# Altium schematic symbol library Capacitor - Aluminium TH.SchLib: 4591 symbols (part 21 of 27) (continued)
## UPS0J103MHD (continued)
CAP ALUM 10000UF 20% 6.3V RADIAL; Part Number: UPS0J103MHD; Manufacturer: Nichicon; TemperatureRange: -55C ~ 105C; Type: Polar; Ripple Current: 2.045A @ 120Hz; Impedance: 33 mOhm; Value: 10000uF; PartId: 27151; Supplier 1: Digi-Key; Supplier Part Number 1: 493-5648-ND; ComponentLink1Description: Datasheet; ComponentLink1URL: http://nichicon-us.com/english/products/pdfs/e-ups.pdf; ComponentLink2Description: Digi-Key Listing; ComponentLink2URL: https://www.digikey.com/product-detail/en/nichicon/UPS0J103MHD/493-5648-ND/2599886; Tolerance: 20%; Voltage: 6.3V; Price: 1.85; Device Package: Radial, Can, 16mm
footprint CAP AL TH D16 L7.5 H33.5
pins: 1, 2

## UPS0J222MHD1TO
designator C?, comment 2200uF  (value not drawn)
CAP ALUM 2200UF 20% 6.3V RADIAL; Part Number: UPS0J222MHD1TO; Manufacturer: Nichicon; TemperatureRange: -55C ~ 105C; Type: Polar; Ripple Current: 1.088A @ 120Hz; Impedance: 75 mOhm; Value: 2200uF; PartId: 23131; Supplier 1: Digi-Key; Supplier Part Number 1: 493-5345-3-ND; ComponentLink1Description: Datasheet; ComponentLink1URL: http://nichicon-us.com/english/products/pdfs/e-ups.pdf; ComponentLink2Description: Digi-Key Listing; ComponentLink2URL: https://www.digikey.com/product-detail/en/nichicon/UPS0J222MHD1TO/493-5345-3-ND/3130350; Tolerance: 20%; Voltage: 6.3V; Price: 0.242; Device Package: Radial, Can, 12.5mm
footprint CAP AL TH D12.5 L5 H22
pins: 1, 2

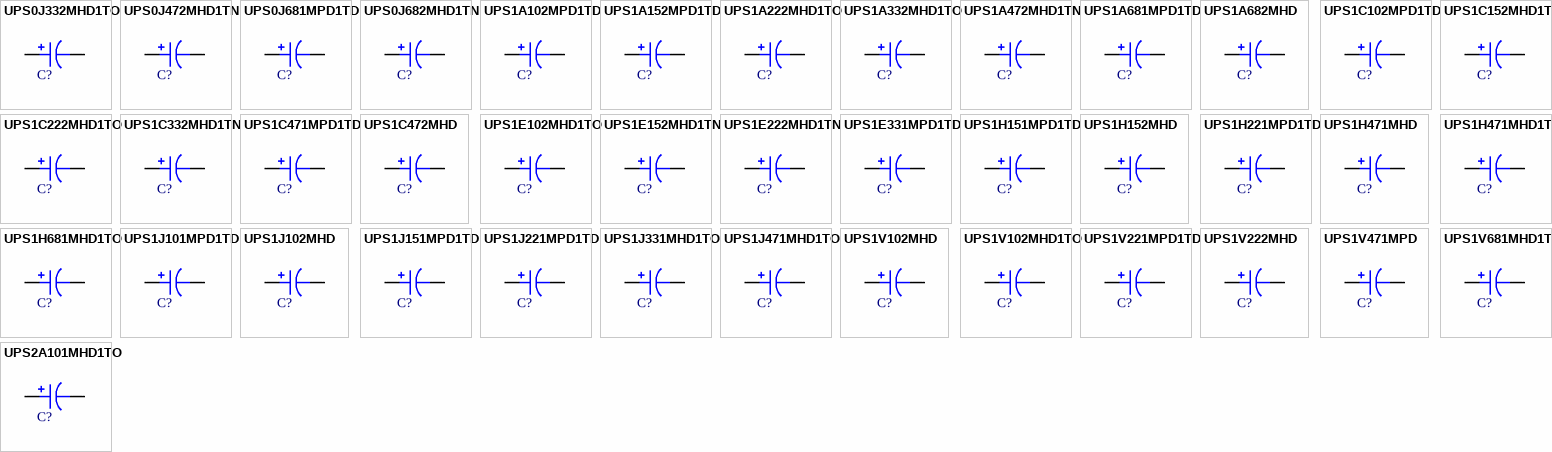
[diagram p90: symbols UPS0J332MHD1TO to UPS2A101MHD1TO]

## UPS0J332MHD1TO
designator C?, comment 3300uF  (value not drawn)
CAP ALUM 3300UF 20% 6.3V RADIAL; Part Number: UPS0J332MHD1TO; Manufacturer: Nichicon; TemperatureRange: -55C ~ 105C; Type: Polar; Ripple Current: 1.088A @ 120Hz; Impedance: 75 mOhm; Value: 3300uF; PartId: 23130; Supplier 1: Digi-Key; Supplier Part Number 1: 493-5348-3-ND; ComponentLink1Description: Datasheet; ComponentLink1URL: http://nichicon-us.com/english/products/pdfs/e-ups.pdf; ComponentLink2Description: Digi-Key Listing; ComponentLink2URL: https://www.digikey.com/product-detail/en/nichicon/UPS0J332MHD1TO/493-5348-3-ND/3130353; Tolerance: 20%; Voltage: 6.3V; Price: 0.2408; Device Package: Radial, Can, 12.5mm
footprint CAP AL TH D12.5 L5 H22
pins: 1, 2

## UPS0J472MHD1TN
designator C?, comment 4700uF  (value not drawn)
CAP ALUM 4700UF 20% 6.3V RADIAL; Part Number: UPS0J472MHD1TN; Manufacturer: Nichicon; TemperatureRange: -55C ~ 105C; Type: Polar; Ripple Current: 1.653A @ 120Hz; Impedance: 38 mOhm; Value: 4700uF; PartId: 26734; Supplier 1: Digi-Key; Supplier Part Number 1: 493-5349-3-ND; ComponentLink1Description: Datasheet; ComponentLink1URL: http://nichicon-us.com/english/products/pdfs/e-ups.pdf; ComponentLink2Description: Digi-Key Listing; ComponentLink2URL: https://www.digikey.com/product-detail/en/nichicon/UPS0J472MHD1TN/493-5349-3-ND/3130354; Tolerance: 20%; Voltage: 6.3V; Price: 0.4559; Device Package: Radial, Can, 16mm
footprint CAP AL TH D16 L7.5 H27
pins: 1, 2

## UPS0J681MPD1TD
designator C?, comment 680uF  (value not drawn)
CAP ALUM 680UF 20% 6.3V RADIAL; Part Number: UPS0J681MPD1TD; Manufacturer: Nichicon; TemperatureRange: -55C ~ 105C; Type: Polar; Ripple Current: 426mA @ 120Hz; Impedance: 190 mOhm; Value: 680uF; PartId: 24516; Supplier 1: Digi-Key; Supplier Part Number 1: 493-5350-3-ND; ComponentLink1Description: Datasheet; ComponentLink1URL: http://nichicon-us.com/english/products/pdfs/e-ups.pdf; ComponentLink2Description: Digi-Key Listing; ComponentLink2URL: https://www.digikey.com/product-detail/en/nichicon/UPS0J681MPD1TD/493-5350-3-ND/3130355; Tolerance: 20%; Voltage: 6.3V; Price: 0.1325; Device Package: Radial, Can, 10mm
footprint CAP AL TH D10 L5 H14.5
pins: 1, 2

## UPS0J682MHD1TN
designator C?, comment 6800uF  (value not drawn)
CAP ALUM 6800UF 20% 6.3V RADIAL; Part Number: UPS0J682MHD1TN; Manufacturer: Nichicon; TemperatureRange: -55C ~ 105C; Type: Polar; Ripple Current: 1.653A @ 120Hz; Impedance: 38 mOhm; Value: 6800uF; PartId: 26744; Supplier 1: Digi-Key; Supplier Part Number 1: 493-5351-3-ND; ComponentLink1Description: Datasheet; ComponentLink1URL: http://nichicon-us.com/english/products/pdfs/e-ups.pdf; ComponentLink2Description: Digi-Key Listing; ComponentLink2URL: https://www.digikey.com/product-detail/en/nichicon/UPS0J682MHD1TN/493-5351-3-ND/3130356; Tolerance: 20%; Voltage: 6.3V; Price: 0.5072; Device Package: Radial, Can, 16mm
footprint CAP AL TH D16 L7.5 H27
pins: 1, 2

## UPS1A102MPD1TD
designator C?, comment 1000uF  (value not drawn)
CAP ALUM 1000UF 20% 10V RADIAL; Part Number: UPS1A102MPD1TD; Manufacturer: Nichicon; TemperatureRange: -55C ~ 105C; Type: Polar; Ripple Current: 696mA @ 120Hz; Impedance: 140 mOhm; Value: 1000uF; PartId: 25020; Supplier 1: Digi-Key; Supplier Part Number 1: 493-11831-3-ND; ComponentLink1Description: Datasheet; ComponentLink1URL: http://nichicon-us.com/english/products/pdfs/e-ups.pdf; ComponentLink2Description: Digi-Key Listing; ComponentLink2URL: https://www.digikey.com/product-detail/en/nichicon/UPS1A102MPD1TD/493-11831-3-ND/4320974; Tolerance: 20%; Voltage: 10V; Price: 0.1626; Device Package: Radial, Can, 10mm
footprint CAP AL TH D10 L5 H17.5
pins: 1, 2

## UPS1A152MPD1TD
designator C?, comment 1500uF  (value not drawn)
CAP ALUM 1500UF 20% 10V RADIAL; Part Number: UPS1A152MPD1TD; Manufacturer: Nichicon; TemperatureRange: -55C ~ 105C; Type: Polar; Ripple Current: 870mA @ 120Hz; Impedance: 110 mOhm; Value: 1500uF; PartId: 25756; Supplier 1: Digi-Key; Supplier Part Number 1: 493-11921-3-ND; ComponentLink1Description: Datasheet; ComponentLink1URL: http://nichicon-us.com/english/products/pdfs/e-ups.pdf; ComponentLink2Description: Digi-Key Listing; ComponentLink2URL: https://www.digikey.com/product-detail/en/nichicon/UPS1A152MPD1TD/493-11921-3-ND/4321064; Tolerance: 20%; Voltage: 10V; Price: 0.2038; Device Package: Radial, Can, 10mm
footprint CAP AL TH D10 L5 H22
pins: 1, 2

## UPS1A222MHD1TO
designator C?, comment 2200uF  (value not drawn)
CAP ALUM 2200UF 20% 10V RADIAL; Part Number: UPS1A222MHD1TO; Manufacturer: Nichicon; TemperatureRange: -55C ~ 105C; Type: Polar; Ripple Current: 1.088A @ 120Hz; Impedance: 75 mOhm; Value: 2200uF; PartId: 23250; Supplier 1: Digi-Key; Supplier Part Number 1: 493-11982-1-ND; ComponentLink1Description: Datasheet; ComponentLink1URL: http://nichicon-us.com/english/products/pdfs/e-ups.pdf; ComponentLink2Description: Digi-Key Listing; ComponentLink2URL: https://www.digikey.com/product-detail/en/nichicon/UPS1A222MHD1TO/493-11982-1-ND/4319709; Tolerance: 20%; Voltage: 10V; Price: 0.7; Device Package: Radial, Can, 12.5mm
footprint CAP AL TH D12.5 L5 H22
pins: 1, 2

## UPS1A332MHD1TO
designator C?, comment 3300uF  (value not drawn)
CAP ALUM 3300UF 20% 10V RADIAL; Part Number: UPS1A332MHD1TO; Manufacturer: Nichicon; TemperatureRange: -55C ~ 105C; Type: Polar; Ripple Current: 1.349A @ 120Hz; Impedance: 57 mOhm; Value: 3300uF; PartId: 23998; Supplier 1: Digi-Key; Supplier Part Number 1: 493-12174-1-ND; ComponentLink1Description: Datasheet; ComponentLink1URL: http://nichicon-us.com/english/products/pdfs/e-ups.pdf; ComponentLink2Description: Digi-Key Listing; ComponentLink2URL: https://www.digikey.com/product-detail/en/nichicon/UPS1A332MHD1TO/493-12174-1-ND/4319711; Tolerance: 20%; Voltage: 10V; Price: 1.04; Device Package: Radial, Can, 12.5mm
footprint CAP AL TH D12.5 L5 H27
pins: 1, 2

## UPS1A472MHD1TN
designator C?, comment 4700uF  (value not drawn)
CAP ALUM 4700UF 20% 10V RADIAL; Part Number: UPS1A472MHD1TN; Manufacturer: Nichicon; TemperatureRange: -55C ~ 105C; Type: Polar; Ripple Current: 1.653A @ 120Hz; Impedance: 38 mOhm; Value: 4700uF; PartId: 26742; Supplier 1: Digi-Key; Supplier Part Number 1: 493-12166-3-ND; ComponentLink1Description: Datasheet; ComponentLink1URL: http://nichicon-us.com/english/products/pdfs/e-ups.pdf; ComponentLink2Description: Digi-Key Listing; ComponentLink2URL: https://www.digikey.com/product-detail/en/nichicon/UPS1A472MHD1TN/493-12166-3-ND/4321309; Tolerance: 20%; Voltage: 10V; Price: 0.5054; Device Package: Radial, Can, 16mm
footprint CAP AL TH D16 L7.5 H27
pins: 1, 2

## UPS1A681MPD1TD
designator C?, comment 680uF  (value not drawn)
CAP ALUM 680UF 20% 10V RADIAL; Part Number: UPS1A681MPD1TD; Manufacturer: Nichicon; TemperatureRange: -55C ~ 105C; Type: Polar; Ripple Current: 426mA @ 120Hz; Impedance: 190 mOhm; Value: 680uF; PartId: 24538; Supplier 1: Digi-Key; Supplier Part Number 1: 493-5355-3-ND; ComponentLink1Description: Datasheet; ComponentLink1URL: http://nichicon-us.com/english/products/pdfs/e-ups.pdf; ComponentLink2Description: Digi-Key Listing; ComponentLink2URL: https://www.digikey.com/product-detail/en/nichicon/UPS1A681MPD1TD/493-5355-3-ND/3130360; Tolerance: 20%; Voltage: 10V; Price: 0.1464; Device Package: Radial, Can, 10mm
footprint CAP AL TH D10 L5 H14.5
pins: 1, 2

## UPS1A682MHD
designator C?, comment 6800uF  (value not drawn)
CAP ALUM 6800UF 20% 10V RADIAL; Part Number: UPS1A682MHD; Manufacturer: Nichicon; TemperatureRange: -55C ~ 105C; Type: Polar; Ripple Current: 2.045A @ 120Hz; Impedance: 33 mOhm; Value: 6800uF; PartId: 27155; Supplier 1: Digi-Key; Supplier Part Number 1: 493-5651-ND; ComponentLink1Description: Datasheet; ComponentLink1URL: http://nichicon-us.com/english/products/pdfs/e-ups.pdf; ComponentLink2Description: Digi-Key Listing; ComponentLink2URL: https://www.digikey.com/product-detail/en/nichicon/UPS1A682MHD/493-5651-ND/2599914; Tolerance: 20%; Voltage: 10V; Price: 1.86; Device Package: Radial, Can, 16mm
footprint CAP AL TH D16 L7.5 H33.5
pins: 1, 2

## UPS1C102MPD1TD
designator C?, comment 1000uF  (value not drawn)
CAP ALUM 1000UF 20% 16V RADIAL; Part Number: UPS1C102MPD1TD; Manufacturer: Nichicon; TemperatureRange: -55C ~ 105C; Type: Polar; Ripple Current: 870mA @ 120Hz; Impedance: 110 mOhm; Value: 1000uF; PartId: 25755; Supplier 1: Digi-Key; Supplier Part Number 1: 493-11922-3-ND; ComponentLink1Description: Datasheet; ComponentLink1URL: http://nichicon-us.com/english/products/pdfs/e-ups.pdf; ComponentLink2Description: Digi-Key Listing; ComponentLink2URL: https://www.digikey.com/product-detail/en/nichicon/UPS1C102MPD1TD/493-11922-3-ND/4321065; Tolerance: 20%; Voltage: 16V; Price: 0.2038; Device Package: Radial, Can, 10mm
footprint CAP AL TH D10 L5 H22
pins: 1, 2

## UPS1C152MHD1TO
designator C?, comment 1500uF  (value not drawn)
CAP ALUM 1500UF 20% 16V RADIAL; Part Number: UPS1C152MHD1TO; Manufacturer: Nichicon; TemperatureRange: -55C ~ 105C; Type: Polar; Ripple Current: 1.088A @ 120Hz; Impedance: 75 mOhm; Value: 1500uF; PartId: 23233; Supplier 1: Digi-Key; Supplier Part Number 1: 493-11975-1-ND; ComponentLink1Description: Datasheet; ComponentLink1URL: http://nichicon-us.com/english/products/pdfs/e-ups.pdf; ComponentLink2Description: Digi-Key Listing; ComponentLink2URL: https://www.digikey.com/product-detail/en/nichicon/UPS1C152MHD1TO/493-11975-1-ND/4319717; Tolerance: 20%; Voltage: 16V; Price: 0.67; Device Package: Radial, Can, 12.5mm
footprint CAP AL TH D12.5 L5 H22
pins: 1, 2

## UPS1C222MHD1TO
designator C?, comment 2200uF  (value not drawn)
CAP ALUM 2200UF 20% 16V RADIAL; Part Number: UPS1C222MHD1TO; Manufacturer: Nichicon; TemperatureRange: -55C ~ 105C; Type: Polar; Ripple Current: 1.349A @ 120Hz; Impedance: 57 mOhm; Value: 2200uF; PartId: 23796; Supplier 1: Digi-Key; Supplier Part Number 1: 493-12077-3-ND; ComponentLink1Description: Datasheet; ComponentLink1URL: http://nichicon-us.com/english/products/pdfs/e-ups.pdf; ComponentLink2Description: Digi-Key Listing; ComponentLink2URL: https://www.digikey.com/product-detail/en/nichicon/UPS1C222MHD1TO/493-12077-3-ND/4321220; Tolerance: 20%; Voltage: 16V; Price: 0.3315; Device Package: Radial, Can, 12.5mm
footprint CAP AL TH D12.5 L5 H27
pins: 1, 2

## UPS1C332MHD1TN
designator C?, comment 3300uF  (value not drawn)
CAP ALUM 3300UF 20% 16V RADIAL; Part Number: UPS1C332MHD1TN; Manufacturer: Nichicon; TemperatureRange: -55C ~ 105C; Type: Polar; Ripple Current: 1.653A @ 120Hz; Impedance: 38 mOhm; Value: 3300uF; PartId: 26741; Supplier 1: Digi-Key; Supplier Part Number 1: 493-5360-3-ND; ComponentLink1Description: Datasheet; ComponentLink1URL: http://nichicon-us.com/english/products/pdfs/e-ups.pdf; ComponentLink2Description: Digi-Key Listing; ComponentLink2URL: https://www.digikey.com/product-detail/en/nichicon/UPS1C332MHD1TN/493-5360-3-ND/3130365; Tolerance: 20%; Voltage: 16V; Price: 0.5052; Device Package: Radial, Can, 16mm
footprint CAP AL TH D16 L7.5 H27
pins: 1, 2

## UPS1C471MPD1TD
designator C?, comment 470uF  (value not drawn)
CAP ALUM 470UF 20% 16V RADIAL; Part Number: UPS1C471MPD1TD; Manufacturer: Nichicon; TemperatureRange: -55C ~ 105C; Type: Polar; Ripple Current: 426mA @ 120Hz; Impedance: 190 mOhm; Value: 470uF; PartId: 24738; Supplier 1: Digi-Key; Supplier Part Number 1: 493-11712-1-ND; ComponentLink1Description: Datasheet; ComponentLink1URL: http://nichicon-us.com/english/products/pdfs/e-ups.pdf; ComponentLink2Description: Digi-Key Listing; ComponentLink2URL: https://www.digikey.com/product-detail/en/nichicon/UPS1C471MPD1TD/493-11712-1-ND/4319720; Tolerance: 20%; Voltage: 16V; Price: 0.41; Device Package: Radial, Can, 10mm
footprint CAP AL TH D10 L5 H14.5
pins: 1, 2

## UPS1C472MHD
designator C?, comment 4700uF  (value not drawn)
CAP ALUM 4700UF 20% 16V RADIAL; Part Number: UPS1C472MHD; Manufacturer: Nichicon; TemperatureRange: -55C ~ 105C; Type: Polar; Ripple Current: 2.045A @ 120Hz; Impedance: 33 mOhm; Value: 4700uF; PartId: 27144; Supplier 1: Digi-Key; Supplier Part Number 1: 493-11147-ND; ComponentLink1Description: Datasheet; ComponentLink1URL: http://nichicon-us.com/english/products/pdfs/e-ups.pdf; ComponentLink2Description: Digi-Key Listing; ComponentLink2URL: https://www.digikey.com/product-detail/en/nichicon/UPS1C472MHD/493-11147-ND/2599929; Tolerance: 20%; Voltage: 16V; Price: 1.81; Device Package: Radial, Can, 16mm
footprint CAP AL TH D16 L7.5 H33.5
pins: 1, 2

## UPS1E102MHD1TO
designator C?, comment 1000uF  (value not drawn)
CAP ALUM 1000UF 20% 25V RADIAL; Part Number: UPS1E102MHD1TO; Manufacturer: Nichicon; TemperatureRange: -55C ~ 105C; Type: Polar; Ripple Current: 1.088A @ 120Hz; Impedance: 75 mOhm; Value: 1000uF; PartId: 23129; Supplier 1: Digi-Key; Supplier Part Number 1: 493-11963-3-ND; ComponentLink1Description: Datasheet; ComponentLink1URL: http://nichicon-us.com/english/products/pdfs/e-ups.pdf; ComponentLink2Description: Digi-Key Listing; ComponentLink2URL: https://www.digikey.com/product-detail/en/nichicon/UPS1E102MHD1TO/493-11963-3-ND/4321106; Tolerance: 20%; Voltage: 25V; Price: 0.2398; Device Package: Radial, Can, 12.5mm
footprint CAP AL TH D12.5 L5 H22
pins: 1, 2

## UPS1E152MHD1TN
designator C?, comment 1500uF  (value not drawn)
CAP ALUM 1500UF 20% 25V RADIAL; Part Number: UPS1E152MHD1TN; Manufacturer: Nichicon; TemperatureRange: -55C ~ 105C; Type: Polar; Ripple Current: 1.653A @ 120Hz; Impedance: 38 mOhm; Value: 1500uF; PartId: 26739; Supplier 1: Digi-Key; Supplier Part Number 1: 493-5364-3-ND; ComponentLink1Description: Datasheet; ComponentLink1URL: http://nichicon-us.com/english/products/pdfs/e-ups.pdf; ComponentLink2Description: Digi-Key Listing; ComponentLink2URL: https://www.digikey.com/product-detail/en/nichicon/UPS1E152MHD1TN/493-5364-3-ND/3130369; Tolerance: 20%; Voltage: 25V; Price: 0.4916; Device Package: Radial, Can, 16mm
footprint CAP AL TH D16 L7.5 H27
pins: 1, 2

## UPS1E222MHD1TN
designator C?, comment 2200uF  (value not drawn)
CAP ALUM 2200UF 20% 25V RADIAL; Part Number: UPS1E222MHD1TN; Manufacturer: Nichicon; TemperatureRange: -55C ~ 105C; Type: Polar; Ripple Current: 1.653A @ 120Hz; Impedance: 38 mOhm; Value: 2200uF; PartId: 26738; Supplier 1: Digi-Key; Supplier Part Number 1: 493-5365-3-ND; ComponentLink1Description: Datasheet; ComponentLink1URL: http://nichicon-us.com/english/products/pdfs/e-ups.pdf; ComponentLink2Description: Digi-Key Listing; ComponentLink2URL: https://www.digikey.com/product-detail/en/nichicon/UPS1E222MHD1TN/493-5365-3-ND/3130370; Tolerance: 20%; Voltage: 25V; Price: 0.488; Device Package: Radial, Can, 16mm
footprint CAP AL TH D16 L7.5 H27
pins: 1, 2

## UPS1E331MPD1TD
designator C?, comment 330uF  (value not drawn)
CAP ALUM 330UF 20% 25V RADIAL; Part Number: UPS1E331MPD1TD; Manufacturer: Nichicon; TemperatureRange: -55C ~ 105C; Type: Polar; Ripple Current: 426mA @ 120Hz; Impedance: 190 mOhm; Value: 330uF; PartId: 24552; Supplier 1: Digi-Key; Supplier Part Number 1: 493-11803-3-ND; ComponentLink1Description: Datasheet; ComponentLink1URL: http://nichicon-us.com/english/products/pdfs/e-ups.pdf; ComponentLink2Description: Digi-Key Listing; ComponentLink2URL: https://www.digikey.com/product-detail/en/nichicon/UPS1E331MPD1TD/493-11803-3-ND/4320946; Tolerance: 20%; Voltage: 25V; Price: 0.15; Device Package: Radial, Can, 10mm
footprint CAP AL TH D10 L5 H14.5
pins: 1, 2

## UPS1H151MPD1TD
designator C?, comment 150uF  (value not drawn)
CAP ALUM 150UF 20% 50V RADIAL; Part Number: UPS1H151MPD1TD; Manufacturer: Nichicon; TemperatureRange: -55C ~ 105C; Type: Polar; Ripple Current: 245mA @ 120Hz; Impedance: 260 mOhm; Value: 150uF; PartId: 24605; Supplier 1: Digi-Key; Supplier Part Number 1: 493-5367-3-ND; ComponentLink1Description: Datasheet; ComponentLink1URL: http://nichicon-us.com/english/products/pdfs/e-ups.pdf; ComponentLink2Description: Digi-Key Listing; ComponentLink2URL: https://www.digikey.com/product-detail/en/nichicon/UPS1H151MPD1TD/493-5367-3-ND/3130372; Tolerance: 20%; Voltage: 50V; Price: 0.182; Device Package: Radial, Can, 10mm
footprint CAP AL TH D10 L5 H14.5
pins: 1, 2

## UPS1H152MHD
designator C?, comment 1500uF  (value not drawn)
CAP ALUM 1500UF 20% 50V RADIAL; Part Number: UPS1H152MHD; Manufacturer: Nichicon; TemperatureRange: -55C ~ 105C; Type: Polar; Ripple Current: 1.74A @ 120Hz; Impedance: 40 mOhm; Value: 1500uF; PartId: 27065; Supplier 1: Digi-Key; Supplier Part Number 1: 493-11148-ND; ComponentLink1Description: Datasheet; ComponentLink1URL: http://nichicon-us.com/english/products/pdfs/e-ups.pdf; ComponentLink2Description: Digi-Key Listing; ComponentLink2URL: https://www.digikey.com/product-detail/en/nichicon/UPS1H152MHD/493-11148-ND/2599952; Tolerance: 20%; Voltage: 50V; Price: 1.62; Device Package: Radial, Can, 16mm
footprint CAP AL TH D16 L7.5 H33.5
pins: 1, 2

## UPS1H221MPD1TD
designator C?, comment 220uF  (value not drawn)
CAP ALUM 220UF 20% 50V RADIAL; Part Number: UPS1H221MPD1TD; Manufacturer: Nichicon; TemperatureRange: -55C ~ 105C; Type: Polar; Ripple Current: 325mA @ 120Hz; Impedance: 180 mOhm; Value: 220uF; PartId: 25037; Supplier 1: Digi-Key; Supplier Part Number 1: 493-11881-3-ND; ComponentLink1Description: Datasheet; ComponentLink1URL: http://nichicon-us.com/english/products/pdfs/e-ups.pdf; ComponentLink2Description: Digi-Key Listing; ComponentLink2URL: https://www.digikey.com/product-detail/en/nichicon/UPS1H221MPD1TD/493-11881-3-ND/4321024; Tolerance: 20%; Voltage: 50V; Price: 0.1844; Device Package: Radial, Can, 10mm
footprint CAP AL TH D10 L5 H17.5
pins: 1, 2

## UPS1H471MHD
designator C?, comment 470uF  (value not drawn)
CAP ALUM 470UF 20% 50V RADIAL; Part Number: UPS1H471MHD; Manufacturer: Nichicon; TemperatureRange: -55C ~ 105C; Type: Polar; Ripple Current: 781mA @ 120Hz; Impedance: 130 mOhm; Value: 470uF; PartId: 22849; Supplier 1: Digi-Key; Supplier Part Number 1: UPS1H471MHD-ND; ComponentLink1Description: Datasheet; ComponentLink1URL: http://nichicon-us.com/english/products/pdfs/e-ups.pdf; ComponentLink2Description: Digi-Key Listing; ComponentLink2URL: https://www.digikey.com/product-detail/en/nichicon/UPS1H471MHD/UPS1H471MHD-ND/2428065; Tolerance: 20%; Voltage: 50V; Price: 0; Device Package: Radial, Can, 12.5mm
footprint CAP AL TH D12.5 L5 H20
pins: 1, 2

## UPS1H471MHD1TO
designator C?, comment 470uF  (value not drawn)
CAP ALUM 470UF 20% 50V RADIAL; Part Number: UPS1H471MHD1TO; Manufacturer: Nichicon; TemperatureRange: -55C ~ 105C; Type: Polar; Ripple Current: 781mA @ 120Hz; Impedance: 130 mOhm; Value: 470uF; PartId: 23137; Supplier 1: Digi-Key; Supplier Part Number 1: 493-11985-3-ND; ComponentLink1Description: Datasheet; ComponentLink1URL: http://nichicon-us.com/english/products/pdfs/e-ups.pdf; ComponentLink2Description: Digi-Key Listing; ComponentLink2URL: https://www.digikey.com/product-detail/en/nichicon/UPS1H471MHD1TO/493-11985-3-ND/4321128; Tolerance: 20%; Voltage: 50V; Price: 0.2527; Device Package: Radial, Can, 12.5mm
footprint CAP AL TH D12.5 L5 H22
pins: 1, 2

## UPS1H681MHD1TO
designator C?, comment 680uF  (value not drawn)
CAP ALUM 680UF 20% 50V RADIAL; Part Number: UPS1H681MHD1TO; Manufacturer: Nichicon; TemperatureRange: -55C ~ 105C; Type: Polar; Ripple Current: 852mA @ 120Hz; Impedance: 100 mOhm; Value: 680uF; PartId: 24028; Supplier 1: Digi-Key; Supplier Part Number 1: 493-12188-1-ND; ComponentLink1Description: Datasheet; ComponentLink1URL: http://nichicon-us.com/english/products/pdfs/e-ups.pdf; ComponentLink2Description: Digi-Key Listing; ComponentLink2URL: https://www.digikey.com/product-detail/en/nichicon/UPS1H681MHD1TO/493-12188-1-ND/4319741; Tolerance: 20%; Voltage: 50V; Price: 1.08; Device Package: Radial, Can, 12.5mm
footprint CAP AL TH D12.5 L5 H27
pins: 1, 2

## UPS1J101MPD1TD
designator C?, comment 100uF  (value not drawn)
CAP ALUM 100UF 20% 63V RADIAL; Part Number: UPS1J101MPD1TD; Manufacturer: Nichicon; TemperatureRange: -55C ~ 105C; Type: Polar; Ripple Current: 195mA @ 120Hz; Impedance: 310 mOhm; Value: 100uF; PartId: 24559; Supplier 1: Digi-Key; Supplier Part Number 1: 493-11805-3-ND; ComponentLink1Description: Datasheet; ComponentLink1URL: http://nichicon-us.com/english/products/pdfs/e-ups.pdf; ComponentLink2Description: Digi-Key Listing; ComponentLink2URL: https://www.digikey.com/product-detail/en/nichicon/UPS1J101MPD1TD/493-11805-3-ND/4320948; Tolerance: 20%; Voltage: 63V; Price: 0.1528; Device Package: Radial, Can, 10mm
footprint CAP AL TH D10 L5 H14.5
pins: 1, 2

## UPS1J102MHD
designator C?, comment 1000uF  (value not drawn)
CAP ALUM 1000UF 20% 63V RADIAL; Part Number: UPS1J102MHD; Manufacturer: Nichicon; TemperatureRange: -55C ~ 105C; Type: Polar; Ripple Current: 1.201A @ 120Hz; Impedance: 49 mOhm; Value: 1000uF; PartId: 27098; Supplier 1: Digi-Key; Supplier Part Number 1: 493-5656-ND; ComponentLink1Description: Datasheet; ComponentLink1URL: http://nichicon-us.com/english/products/pdfs/e-ups.pdf; ComponentLink2Description: Digi-Key Listing; ComponentLink2URL: https://www.digikey.com/product-detail/en/nichicon/UPS1J102MHD/493-5656-ND/2599968; Tolerance: 20%; Voltage: 63V; Price: 1.73; Device Package: Radial, Can, 16mm
footprint CAP AL TH D16 L7.5 H33.5
pins: 1, 2

## UPS1J151MPD1TD
designator C?, comment 150uF  (value not drawn)
CAP ALUM 150UF 20% 63V RADIAL; Part Number: UPS1J151MPD1TD; Manufacturer: Nichicon; TemperatureRange: -55C ~ 105C; Type: Polar; Ripple Current: 220mA @ 120Hz; Impedance: 250 mOhm; Value: 150uF; PartId: 25064; Supplier 1: Digi-Key; Supplier Part Number 1: 493-5373-3-ND; ComponentLink1Description: Datasheet; ComponentLink1URL: http://nichicon-us.com/english/products/pdfs/e-ups.pdf; ComponentLink2Description: Digi-Key Listing; ComponentLink2URL: https://www.digikey.com/product-detail/en/nichicon/UPS1J151MPD1TD/493-5373-3-ND/3130378; Tolerance: 20%; Voltage: 63V; Price: 0.2228; Device Package: Radial, Can, 10mm
footprint CAP AL TH D10 L5 H17.5
pins: 1, 2

## UPS1J221MPD1TD
designator C?, comment 220uF  (value not drawn)
CAP ALUM 220UF 20% 63V RADIAL; Part Number: UPS1J221MPD1TD; Manufacturer: Nichicon; TemperatureRange: -55C ~ 105C; Type: Polar; Ripple Current: 350mA @ 120Hz; Impedance: 200 mOhm; Value: 220uF; PartId: 25769; Supplier 1: Digi-Key; Supplier Part Number 1: 493-11951-3-ND; ComponentLink1Description: Datasheet; ComponentLink1URL: http://nichicon-us.com/english/products/pdfs/e-ups.pdf; ComponentLink2Description: Digi-Key Listing; ComponentLink2URL: https://www.digikey.com/product-detail/en/nichicon/UPS1J221MPD1TD/493-11951-3-ND/4321094; Tolerance: 20%; Voltage: 63V; Price: 0.2262; Device Package: Radial, Can, 10mm
footprint CAP AL TH D10 L5 H22
pins: 1, 2

## UPS1J331MHD1TO
designator C?, comment 330uF  (value not drawn)
CAP ALUM 330UF 20% 63V RADIAL; Part Number: UPS1J331MHD1TO; Manufacturer: Nichicon; TemperatureRange: -55C ~ 105C; Type: Polar; Ripple Current: 695.8mA @ 120Hz; Impedance: 120 mOhm; Value: 330uF; PartId: 23157; Supplier 1: Digi-Key; Supplier Part Number 1: 493-12049-3-ND; ComponentLink1Description: Datasheet; ComponentLink1URL: http://nichicon-us.com/english/products/pdfs/e-ups.pdf; ComponentLink2Description: Digi-Key Listing; ComponentLink2URL: https://www.digikey.com/product-detail/en/nichicon/UPS1J331MHD1TO/493-12049-3-ND/4321192; Tolerance: 20%; Voltage: 63V; Price: 0.314; Device Package: Radial, Can, 12.5mm
footprint CAP AL TH D12.5 L5 H22
pins: 1, 2

## UPS1J471MHD1TO
designator C?, comment 470uF  (value not drawn)
CAP ALUM 470UF 20% 63V RADIAL; Part Number: UPS1J471MHD1TO; Manufacturer: Nichicon; TemperatureRange: -55C ~ 105C; Type: Polar; Ripple Current: 852mA @ 120Hz; Impedance: 81 mOhm; Value: 470uF; PartId: 23824; Supplier 1: Digi-Key; Supplier Part Number 1: 493-12175-3-ND; ComponentLink1Description: Datasheet; ComponentLink1URL: http://nichicon-us.com/english/products/pdfs/e-ups.pdf; ComponentLink2Description: Digi-Key Listing; ComponentLink2URL: https://www.digikey.com/product-detail/en/nichicon/UPS1J471MHD1TO/493-12175-3-ND/4321318; Tolerance: 20%; Voltage: 63V; Price: 0.4411; Device Package: Radial, Can, 12.5mm
footprint CAP AL TH D12.5 L5 H27
pins: 1, 2

## UPS1V102MHD
designator C?, comment 1000uF  (value not drawn)
CAP ALUM 1000UF 20% 35V RADIAL; Part Number: UPS1V102MHD; Manufacturer: Nichicon; TemperatureRange: -55C ~ 105C; Type: Polar; Ripple Current: 1.349A @ 120Hz; Impedance: 57 mOhm; Value: 1000uF; PartId: 23574; Supplier 1: Digi-Key; Supplier Part Number 1: UPS1V102MHD-ND; ComponentLink1Description: Datasheet; ComponentLink1URL: http://nichicon-us.com/english/products/pdfs/e-ups.pdf; ComponentLink2Description: Digi-Key Listing; ComponentLink2URL: https://www.digikey.com/product-detail/en/nichicon/UPS1V102MHD/UPS1V102MHD-ND/2428064; Tolerance: 20%; Voltage: 35V; Price: 0.97; Device Package: Radial, Can, 12.5mm
footprint CAP AL TH D12.5 L5 H25
pins: 1, 2

## UPS1V102MHD1TO
designator C?, comment 1000uF  (value not drawn)
CAP ALUM 1000UF 20% 35V RADIAL; Part Number: UPS1V102MHD1TO; Manufacturer: Nichicon; TemperatureRange: -55C ~ 105C; Type: Polar; Ripple Current: 1.349A @ 120Hz; Impedance: 57 mOhm; Value: 1000uF; PartId: 23948; Supplier 1: Digi-Key; Supplier Part Number 1: 493-12150-1-ND; ComponentLink1Description: Datasheet; ComponentLink1URL: http://nichicon-us.com/english/products/pdfs/e-ups.pdf; ComponentLink2Description: Digi-Key Listing; ComponentLink2URL: https://www.digikey.com/product-detail/en/nichicon/UPS1V102MHD1TO/493-12150-1-ND/4319750; Tolerance: 20%; Voltage: 35V; Price: 0.97; Device Package: Radial, Can, 12.5mm
footprint CAP AL TH D12.5 L5 H27
pins: 1, 2

## UPS1V221MPD1TD
designator C?, comment 220uF  (value not drawn)
CAP ALUM 220UF 20% 35V RADIAL; Part Number: UPS1V221MPD1TD; Manufacturer: Nichicon; TemperatureRange: -55C ~ 105C; Type: Polar; Ripple Current: 300mA @ 120Hz; Impedance: 190 mOhm; Value: 220uF; PartId: 24560; Supplier 1: Digi-Key; Supplier Part Number 1: 493-11807-3-ND; ComponentLink1Description: Datasheet; ComponentLink1URL: http://nichicon-us.com/english/products/pdfs/e-ups.pdf; ComponentLink2Description: Digi-Key Listing; ComponentLink2URL: https://www.digikey.com/product-detail/en/nichicon/UPS1V221MPD1TD/493-11807-3-ND/4320950; Tolerance: 20%; Voltage: 35V; Price: 0.1534; Device Package: Radial, Can, 10mm
footprint CAP AL TH D10 L5 H14.5
pins: 1, 2

## UPS1V222MHD
designator C?, comment 2200uF  (value not drawn)
CAP ALUM 2200UF 20% 35V RADIAL; Part Number: UPS1V222MHD; Manufacturer: Nichicon; TemperatureRange: -55C ~ 105C; Type: Polar; Ripple Current: 2.045A @ 120Hz; Impedance: 33 mOhm; Value: 2200uF; PartId: 27033; Supplier 1: Digi-Key; Supplier Part Number 1: 493-11152-ND; ComponentLink1Description: Datasheet; ComponentLink1URL: http://nichicon-us.com/english/products/pdfs/e-ups.pdf; ComponentLink2Description: Digi-Key Listing; ComponentLink2URL: https://www.digikey.com/product-detail/en/nichicon/UPS1V222MHD/493-11152-ND/2600007; Tolerance: 20%; Voltage: 35V; Price: 1.51; Device Package: Radial, Can, 16mm
footprint CAP AL TH D16 L7.5 H33.5
pins: 1, 2

## UPS1V471MPD
designator C?, comment 470uF  (value not drawn)
CAP ALUM 470UF 20% 35V RADIAL; Part Number: UPS1V471MPD; Manufacturer: Nichicon; TemperatureRange: -55C ~ 105C; Type: Polar; Ripple Current: 710mA @ 120Hz; Impedance: 110 mOhm; Value: 470uF; PartId: 25942; Supplier 1: Digi-Key; Supplier Part Number 1: UPS1V471MPD-ND; ComponentLink1Description: Datasheet; ComponentLink1URL: http://nichicon-us.com/english/products/pdfs/e-ups.pdf; ComponentLink2Description: Digi-Key Listing; ComponentLink2URL: https://www.digikey.com/product-detail/en/nichicon/UPS1V471MPD/UPS1V471MPD-ND/2600017; Tolerance: 20%; Voltage: 35V; Price: 0.74; Device Package: Radial, Can, 10mm
footprint CAP AL TH D10 L5 H22
pins: 1, 2

## UPS1V681MHD1TO
designator C?, comment 680uF  (value not drawn)
CAP ALUM 680UF 20% 35V RADIAL; Part Number: UPS1V681MHD1TO; Manufacturer: Nichicon; TemperatureRange: -55C ~ 105C; Type: Polar; Ripple Current: 887.5mA @ 120Hz; Impedance: 75 mOhm; Value: 680uF; PartId: 23244; Supplier 1: Digi-Key; Supplier Part Number 1: 493-11980-1-ND; ComponentLink1Description: Datasheet; ComponentLink1URL: http://nichicon-us.com/english/products/pdfs/e-ups.pdf; ComponentLink2Description: Digi-Key Listing; ComponentLink2URL: https://www.digikey.com/product-detail/en/nichicon/UPS1V681MHD1TO/493-11980-1-ND/4319759; Tolerance: 20%; Voltage: 35V; Price: 0.69; Device Package: Radial, Can, 12.5mm
footprint CAP AL TH D12.5 L5 H22
pins: 1, 2

## UPS2A101MHD1TO
designator C?, comment 100uF  (value not drawn)
CAP ALUM 100UF 20% 100V RADIAL; Part Number: UPS2A101MHD1TO; Manufacturer: Nichicon; TemperatureRange: -55C ~ 105C; Type: Polar; Ripple Current: 290mA @ 120Hz; Impedance: 180 mOhm; Value: 100uF; PartId: 23126; Supplier 1: Digi-Key; Supplier Part Number 1: 493-11961-3-ND; ComponentLink1Description: Datasheet; ComponentLink1URL: http://nichicon-us.com/english/products/pdfs/e-ups.pdf; ComponentLink2Description: Digi-Key Listing; ComponentLink2URL: https://www.digikey.com/product-detail/en/nichicon/UPS2A101MHD1TO/493-11961-3-ND/4321104; Tolerance: 20%; Voltage: 100V; Price: 0.2362; Device Package: Radial, Can, 12.5mm
footprint CAP AL TH D12.5 L5 H22
pins: 1, 2

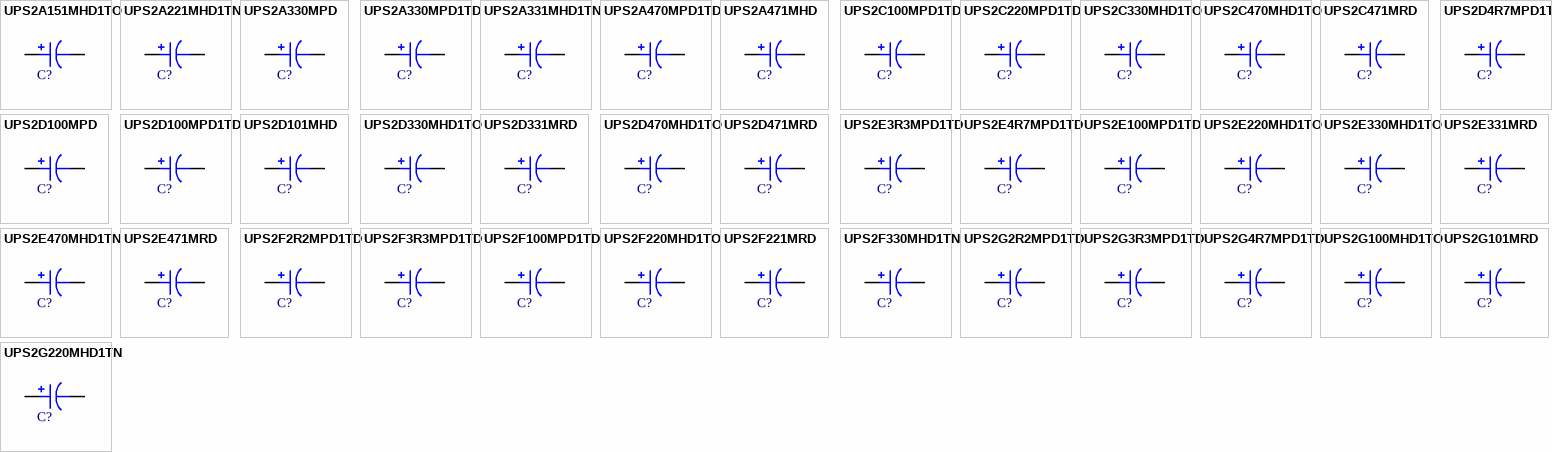
[diagram p91: symbols UPS2A151MHD1TO to UPS2G220MHD1TN]

## UPS2A151MHD1TO
designator C?, comment 150uF  (value not drawn)
CAP ALUM 150UF 20% 100V RADIAL; Part Number: UPS2A151MHD1TO; Manufacturer: Nichicon; TemperatureRange: -55C ~ 105C; Type: Polar; Ripple Current: 355mA @ 120Hz; Impedance: 130 mOhm; Value: 150uF; PartId: 23828; Supplier 1: Digi-Key; Supplier Part Number 1: 493-5379-3-ND; ComponentLink1Description: Datasheet; ComponentLink1URL: http://nichicon-us.com/english/products/pdfs/e-ups.pdf; ComponentLink2Description: Digi-Key Listing; ComponentLink2URL: https://www.digikey.com/product-detail/en/nichicon/UPS2A151MHD1TO/493-5379-3-ND/3130384; Tolerance: 20%; Voltage: 100V; Price: 0.45; Device Package: Radial, Can, 12.5mm
footprint CAP AL TH D12.5 L5 H27
pins: 1, 2